# Altium footprint library ICs.PcbLib: 86 footprints (part 3 of 6) (continued)
## QFN28_LONG_ERRLES [mil] "QFN28_LONG_ERRLES"
pads (29):
  rect 14x50 smd: 1(-76.56,-118.56)
  oval 14x50 smd: 2(-51.55,-118.56) 3(-25.55,-118.56) 4(0.45,-118.56) 5(26.04,-118.56) 6(51.63,-118.56) 7(77.22,-118.56) 15(77.22,118.56) 16(51.63,118.56) 17(26.04,118.56) 18(0.45,118.56) 19(-25.55,118.56) 20(-51.55,118.56) 21(-76.56,118.56)
  oval 50x14 smd: 8(118.56,-77.22) 9(118.56,-51.63) 10(118.56,-26.04) 11(118.56,-0.44) 12(118.56,25.56) 13(118.56,51.56) 14(118.56,76.56) 22(-118.56,76.56) 23(-118.56,51.56) 24(-118.56,25.56) 25(-118.56,-0.44) 26(-118.56,-26.04) 27(-118.56,-51.63) 28(-118.56,-77.22)
  rrect20% 130x130 smd: EXP(0.45,-0.44)
Top Overlay:
  circle w11.81: c-125.54,-128.4 r3.94
  lines w8: -115.63,101.92 -115.63,114.56 -101.92,114.56 ; -114.56,-100.84 -114.56,-114.56 -101.92,-114.56 ; 100.84,-115.44 114.56,-115.44 114.56,-102.81 ; 100.84,113.67 113.48,113.67 113.48,99.95
Mechanical 15:
  circle w11.81: c-125.54,-130.37 r1.97
  lines w1.97: -149.16,-150.05 150.05,-150.05 150.05,149.16 -149.16,149.16 -149.16,-150.05
3D body: height 39.37, standoff 7.87, extent -113.73,-114.62 114.62,113.73

## QFN28_LONG_ERRLES-Vias [mm] "QFN28_LONG_ERRLES"
pads (42):
  rect 0.356x1.27 smd: 1(-1.944,-3.011)
  oval 0.356x1.27 smd: 2(-1.309,-3.011) 3(-0.649,-3.011) 4(0.011,-3.011) 5(0.661,-3.011) 6(1.311,-3.011) 7(1.961,-3.011) 15(1.961,3.011) 16(1.311,3.011) 17(0.661,3.011) 18(0.011,3.011) 19(-0.649,3.011) 20(-1.309,3.011) 21(-1.944,3.011)
  oval 1.27x0.356 smd: 8(3.011,-1.961) 9(3.011,-1.311) 10(3.011,-0.661) 11(3.011,-0.011) 12(3.011,0.649) 13(3.011,1.31) 14(3.011,1.945) 22(-3.011,1.945) 23(-3.011,1.31) 24(-3.011,0.649) 25(-3.011,-0.011) 26(-3.011,-0.661) 27(-3.011,-1.311) 28(-3.011,-1.961)
  round 0.6 hole 0.381: EXP(-1.25,-1.25) EXP(-1.25,1.25) EXP(-1.2,0) EXP(-0.55,-0.7) EXP(-0.55,0.7) EXP(-0.05,1.25) EXP(0,0) EXP(0.05,-1.25) EXP(0.55,-0.7) EXP(0.55,0.7) EXP(1.2,0) EXP(1.25,-1.25) EXP(1.25,1.25)
  rrect20% 3.302x3.302 smd: EXP(0.011,-0.011)
Top Overlay:
  circle w0.3: c-3.189,-3.261 r0.1
  lines w0.203: -2.937,2.589 -2.937,2.91 -2.589,2.91 ; -2.91,-2.561 -2.91,-2.91 -2.589,-2.91 ; 2.561,-2.932 2.91,-2.932 2.91,-2.611 ; 2.561,2.887 2.882,2.887 2.882,2.539
Mechanical 15:
  circle w0.3: c-3.189,-3.311 r0.05
  lines w0.05: -3.789,-3.811 -3.789,3.789 3.811,3.789 3.811,-3.811 -3.789,-3.811
3D body: height 1, standoff 0.2, extent -2.889,-2.911 2.911,2.889

## QFN32_L [mm] "32-Pin Quad Flat Pack 0.5 mm Pitch, IPC High Density"
height 1.85
pads (33):
  rrect20% 1x0.28 smd: 1(-2.5,1.75)
  oval 1x0.28 smd: 2(-2.5,1.25) 3(-2.5,0.75) 4(-2.5,0.25) 5(-2.5,-0.25) 6(-2.5,-0.75) 7(-2.5,-1.25) 8(-2.5,-1.75) 17(2.5,-1.75) 18(2.5,-1.25) 19(2.5,-0.75) 20(2.5,-0.25) 21(2.5,0.25) 22(2.5,0.75) 23(2.5,1.25) 24(2.5,1.75)
  oval 0.28x1 smd: 9(-1.75,-2.5) 10(-1.25,-2.5) 11(-0.75,-2.5) 12(-0.25,-2.5) 13(0.25,-2.5) 14(0.75,-2.5) 15(1.25,-2.5) 16(1.75,-2.5) 25(1.75,2.5) 26(1.25,2.5) 27(0.75,2.5) 28(0.25,2.5) 29(-0.25,2.5) 30(-0.75,2.5) 31(-1.25,2.5) 32(-1.75,2.5)
  rrect10% 2.6x2.6 smd: 33(0,0)
Top Overlay:
  circle w0.25: c-3.7,2.15 r0.125
  lines w0.2: -3.3,-3.3 -3.3,3.3 3.3,3.3 3.3,-3.3 -3.3,-3.3
Mechanical 1:
  lines w0.1: -2.5,-2.5 -2.5,2.5 2.5,2.5 2.5,-2.5 -2.5,-2.5
Mechanical 15:
  circle w0.1: c-3.7,2.15 r0.1
  lines w0.1: -0.5,0 0.5,0 ; 0,-0.5 0,0.5 ; -3.2,-3.2 -3.2,3.2 3.2,3.2 3.2,-3.2 -3.2,-3.2
3D body: height 1.85, standoff 0, extent -2.5,-2.5 2.5,2.5

## QFN32_L-Vias [mm] "32-Pin Quad Flat Pack 0.5 mm Pitch, IPC High Density"
height 1.85
pads (33):
  rrect20% 1x0.28 smd: 1(-2.5,1.75)
  oval 1x0.28 smd: 2(-2.5,1.25) 3(-2.5,0.75) 4(-2.5,0.25) 5(-2.5,-0.25) 6(-2.5,-0.75) 7(-2.5,-1.25) 8(-2.5,-1.75) 17(2.5,-1.75) 18(2.5,-1.25) 19(2.5,-0.75) 20(2.5,-0.25) 21(2.5,0.25) 22(2.5,0.75) 23(2.5,1.25) 24(2.5,1.75)
  oval 0.28x1 smd: 9(-1.75,-2.5) 10(-1.25,-2.5) 11(-0.75,-2.5) 12(-0.25,-2.5) 13(0.25,-2.5) 14(0.75,-2.5) 15(1.25,-2.5) 16(1.75,-2.5) 25(1.75,2.5) 26(1.25,2.5) 27(0.75,2.5) 28(0.25,2.5) 29(-0.25,2.5) 30(-0.75,2.5) 31(-1.25,2.5) 32(-1.75,2.5)
  rrect10% 2.6x2.6 smd: 33(0,0)
via 0,0 diameter 0.6 hole 0.381
via 0.95,0 diameter 0.6 hole 0.381
via -0.95,0 diameter 0.6 hole 0.381
via 0.95,-0.95 diameter 0.6 hole 0.381
via 0,-0.95 diameter 0.6 hole 0.381
via -1,-0.95 diameter 0.6 hole 0.381
via 0.95,0.95 diameter 0.6 hole 0.381
via 0,0.95 diameter 0.6 hole 0.381
via -0.95,0.95 diameter 0.6 hole 0.381
Top Overlay:
  circle w0.25: c-3.7,2.15 r0.125
  lines w0.2: -3.3,-3.3 3.3,-3.3 3.3,3.3 -3.3,3.3 -3.3,-3.3
Mechanical 1:
  lines w0.1: -2.5,-2.5 2.5,-2.5 2.5,2.5 -2.5,2.5 -2.5,-2.5
Mechanical 15:
  circle w0.1: c-3.7,2.15 r0.1
  lines w0.1: -0.5,0 0.5,0 ; 0,-0.5 0,0.5 ; -3.2,-3.2 3.2,-3.2 3.2,3.2 -3.2,3.2 -3.2,-3.2
3D body: height 1.85, standoff 0, extent -2.5,-2.5 2.5,2.5

## QFP32_L [mm] "32-Pin Quad Flat Pack 0.8 mm Pitch, IPC High Density"
height 1.85
pads (32):
  oval 1.35x0.55 smd: 1(-4.15,2.8) 2(-4.15,2) 3(-4.15,1.2) 4(-4.15,0.4) 5(-4.15,-0.4) 6(-4.15,-1.2) 7(-4.15,-2) 8(-4.15,-2.8) 17(4.15,-2.8) 18(4.15,-2) 19(4.15,-1.2) 20(4.15,-0.4) 21(4.15,0.4) 22(4.15,1.2) 23(4.15,2) 24(4.15,2.8)
  oval 0.55x1.35 smd: 9(-2.8,-4.15) 10(-2,-4.15) 11(-1.2,-4.15) 12(-0.4,-4.15) 13(0.4,-4.15) 14(1.2,-4.15) 15(2,-4.15) 16(2.8,-4.15) 25(2.8,4.15) 26(2,4.15) 27(1.2,4.15) 28(0.4,4.15) 29(-0.4,4.15) 30(-1.2,4.15) 31(-2,4.15) 32(-2.8,4.15)
Top Overlay:
  circle w0.25: c-4.15,3.625 r0.125
  lines w0.2: -3.05,-3.05 3.05,-3.05 3.05,3.05 -3.05,3.05 -3.05,-3.05
Mechanical 1:
  circle w0.1: c-4.15,3.6 r0.2
  lines w0.1: -3.5,-3.5 3.5,-3.5 3.5,3.5 -3.5,3.5 -3.5,-3.5
Mechanical 15:
  lines w0.1: -0.5,0 0.5,0 ; 0,-0.5 0,0.5 ; -4.9,-4.9 4.9,-4.9 4.9,4.9 -4.9,4.9 -4.9,-4.9
3D body: height 1.85, standoff 0, extent -3.5,-3.5 3.5,3.5

## Quad128 [mm]
pads (129):
  rect 8x8 smd: 0(0,0)
  rect 0.35x1.5 smd: 1(-9.25,-7.95)
  oval 0.35x1.5 smd: 2(-8.75,-7.95) 3(-8.25,-7.95) 4(-7.75,-7.95) 5(-7.25,-7.95) 6(-6.75,-7.95) 7(-6.25,-7.95) 8(-5.75,-7.95) 9(-5.25,-7.95) 10(-4.75,-7.95) 11(-4.25,-7.95) 12(-3.75,-7.95) 13(-3.25,-7.95) 14(-2.75,-7.95) 15(-2.25,-7.95) 16(-1.75,-7.95) 17(-1.25,-7.95) 18(-0.75,-7.95) 19(-0.25,-7.95) 20(0.25,-7.95) 21(0.75,-7.95) 22(1.25,-7.95) 23(1.75,-7.95) 24(2.25,-7.95) 25(2.75,-7.95) 26(3.25,-7.95) 27(3.75,-7.95) 28(4.25,-7.95) 29(4.75,-7.95) 30(5.25,-7.95) 31(5.75,-7.95) 32(6.25,-7.95) 33(6.75,-7.95) 34(7.25,-7.95) 35(7.75,-7.95) 36(8.25,-7.95) 37(8.75,-7.95) 38(9.25,-7.95) 65(9.25,7.95) 66(8.75,7.95) 67(8.25,7.95) 68(7.75,7.95) 69(7.25,7.95) 70(6.75,7.95) 71(6.25,7.95) 72(5.75,7.95) 73(5.25,7.95) 74(4.75,7.95) 75(4.25,7.95) 76(3.75,7.95) 77(3.25,7.95) 78(2.75,7.95) 79(2.25,7.95) 80(1.75,7.95) 81(1.25,7.95) 82(0.75,7.95) 83(0.25,7.95) 84(-0.25,7.95) 85(-0.75,7.95) 86(-1.25,7.95) 87(-1.75,7.95) 88(-2.25,7.95) 89(-2.75,7.95) 90(-3.25,7.95) 91(-3.75,7.95) 92(-4.25,7.95) 93(-4.75,7.95) 94(-5.25,7.95) 95(-5.75,7.95) 96(-6.25,7.95) 97(-6.75,7.95) 98(-7.25,7.95) 99(-7.75,7.95) 100(-8.25,7.95) 101(-8.75,7.95) 102(-9.25,7.95)
  oval 1.5x0.35 smd: 39(10.95,-6.25) 40(10.95,-5.75) 41(10.95,-5.25) 42(10.95,-4.75) 43(10.95,-4.25) 44(10.95,-3.75) 45(10.95,-3.25) 46(10.95,-2.75) 47(10.95,-2.25) 48(10.95,-1.75) 49(10.95,-1.25) 50(10.95,-0.75) 51(10.95,-0.25) 52(10.95,0.25) 53(10.95,0.75) 54(10.95,1.25) 55(10.95,1.75) 56(10.95,2.25) 57(10.95,2.75) 58(10.95,3.25) 59(10.95,3.75) 60(10.95,4.25) 61(10.95,4.75) 62(10.95,5.25) 63(10.95,5.75) 64(10.95,6.25) 103(-10.95,6.25) 104(-10.95,5.75) 105(-10.95,5.25) 106(-10.95,4.75) 107(-10.95,3.75) 108(-10.95,4.25) 109(-10.95,2.75) 110(-10.95,3.25) 111(-10.95,2.25) 112(-10.95,1.75) 113(-10.95,1.25) 114(-10.95,0.75) 115(-10.95,0.25) 116(-10.95,-0.25) 117(-10.95,-0.75) 118(-10.95,-1.25) 119(-10.95,-1.75) 120(-10.95,-2.25) 121(-10.95,-2.75) 122(-10.95,-3.25) 123(-10.95,-3.75) 124(-10.95,-4.25) 125(-10.95,-4.75) 126(-10.95,-5.25) 127(-10.95,-5.75) 128(-10.95,-6.25)
via 1.55,3.15 diameter 0.6 hole 0.381
via -1.55,3.15 diameter 0.6 hole 0.381
via -1.55,1.6 diameter 0.6 hole 0.381
via 1.55,1.6 diameter 0.6 hole 0.381
via 1.55,0 diameter 0.6 hole 0.381
via 1.55,-1.6 diameter 0.6 hole 0.381
via 1.55,-3.15 diameter 0.6 hole 0.381
via -1.55,-3.15 diameter 0.6 hole 0.381
via -1.55,-1.6 diameter 0.6 hole 0.381
via -1.55,0 diameter 0.6 hole 0.381
via 0,0 diameter 0.6 hole 0.381
via 3.2,-1.6 diameter 0.6 hole 0.381
via 3.2,1.6 diameter 0.6 hole 0.381
via 3.2,0 diameter 0.6 hole 0.381
via 0,-1.6 diameter 0.6 hole 0.381
via -0.05,1.6 diameter 0.6 hole 0.381
via -3.2,1.6 diameter 0.6 hole 0.381
via -3.2,-1.6 diameter 0.6 hole 0.381
via -3.2,0 diameter 0.6 hole 0.381
via 3.2,-3.15 diameter 0.6 hole 0.381
via -3.2,-3.15 diameter 0.6 hole 0.381
via 0,-3.15 diameter 0.6 hole 0.381
via 3.2,3.15 diameter 0.6 hole 0.381
via 0,3.15 diameter 0.6 hole 0.381
via -3.2,3.15 diameter 0.6 hole 0.381
Top Overlay:
  circle w0.3: c-9.25,-9.3 r0.206
  lines w0.2: -12.15,-9.15 12.15,-9.15 12.15,9.15 -12.15,9.15 -12.15,-9.15
Mechanical 1:
  lines w0.05: -9.85,-6.7 9.9,-6.7 9.9,6.75 -9.85,6.75 -9.85,-6.7
Mechanical 15:
  circle w0.3: c-9.25,-9.3 r0.206
  lines w0.05: -0.25,0 0.25,0 ; 0,-0.25 0,0.25 ; -12.1,-9.15 12.15,-9.15 12.15,9.1 -12.1,9.1 -12.1,-9.15
3D body: height 1, standoff 0, extent -9.85,-6.725 9.9,6.725

## R-783_3-0_5 [mm] "Recon DC-DC"
height 10.2
pads (3):
  rect 1.6x1.6 hole 1: 1(-2.54,0)
  round 1.6 hole 1: 2(0,0) 3(2.54,0)
Top Overlay:
  circle w0.25: c-4.7,-1.2 r0.125
  lines w0.2: -5.75,-2 5.75,-2 5.75,5.55 -5.75,5.55 -5.75,-2
Mechanical 15:
  lines w0.1: -0.5,0 0.5,0 ; 0,-0.5 0,0.5
3D body: height 10.2, standoff 0, extent -5.715,-2.032 5.715,5.588

## SG - 211 S*E [mm]
height 1.3
pads (4):
  rect 1.1x0.9 smd: 1(-0.85,-0.65) 2(0.85,-0.65) 3(0.85,0.65) 4(-0.85,0.65)
Top Overlay:
  circle w0.25: c-1.9,-1.55 r0.125
  lines w0.05: -1.6,-1.3 -1.6,1.3 1.6,1.3 1.6,-1.3 -1.6,-1.3
Mechanical 1:
  lines w0.1: -1.25,-1 1.25,-1 1.25,1 -1.25,1 -1.25,-1
Mechanical 15:
  lines w0.1: -0.5,0 0.5,0 ; 0,-0.5 0,0.5 ; -1.6,-1.3 1.6,-1.3 1.6,1.3 -1.6,1.3 -1.6,-1.3
3D body: height 1.3, standoff 0, extent -1.25,-1 1.25,1

## SKT256-6064 [mil] "SKT256-6064"
pads (262):
  round 40 / inner round 93 / far side round 40 hole 63: " "(-388.3,-388.3) " "(-388.3,388.3) " "(388.3,-388.3) " "(388.3,388.3)
  round 20 / inner round 80 / far side round 20 hole 34: " "(-388.3,-188.3) " "(388.3,288.3)
  round 20 smd: A1(-280.4,295.5) A2(-241,295.5) A3(-201.6,295.5) A4(-162.2,295.5) A5(-122.8,295.5) A6(-83.4,295.5) A7(-44,295.5) A8(-4.6,295.5) A9(34.8,295.5) A10(74.2,295.5) A11(113.6,295.5) A12(153,295.5) A13(192.4,295.5) A14(231.8,295.5) A15(271.2,295.5) A16(310.6,295.5) B1(-280.4,256.1) B2(-241,256.1) B3(-201.6,256.1) B4(-162.2,256.1) B5(-122.8,256.1) B6(-83.4,256.1) B7(-44,256.1) B8(-4.6,256.1) B9(34.8,256.1) B10(74.2,256.1) B11(113.6,256.1) B12(153,256.1) B13(192.4,256.1) B14(231.8,256.1) B15(271.2,256.1) B16(310.6,256.1) C1(-280.4,216.7) C2(-241,216.7) C3(-201.6,216.7) C4(-162.2,216.7) C5(-122.8,216.7) C6(-83.4,216.7) C7(-44,216.7) C8(-4.6,216.7) C9(34.8,216.7) C10(74.2,216.7) C11(113.6,216.7) C12(153,216.7) C13(192.4,216.7) C14(231.8,216.7) C15(271.2,216.7) C16(310.6,216.7) D1(-280.4,177.3) D2(-241,177.3) D3(-201.6,177.3) D4(-162.2,177.3) D5(-122.8,177.3) D6(-83.4,177.3) D7(-44,177.3) D8(-4.6,177.3) D9(34.8,177.3) D10(74.2,177.3) D11(113.6,177.3) D12(153,177.3) D13(192.4,177.3) D14(231.8,177.3) D15(271.2,177.3) D16(310.6,177.3) E1(-280.4,137.9) E2(-241,137.9) E3(-201.6,137.9) E4(-162.2,137.9) E5(-122.8,137.9) E6(-83.4,137.9) E7(-44,137.9) E8(-4.6,137.9) E9(34.8,137.9) E10(74.2,137.9) E11(113.6,137.9) E12(153,137.9) E13(192.4,137.9) E14(231.8,137.9) E15(271.2,137.9) E16(310.6,137.9) F1(-280.4,98.5) F2(-241,98.5) F3(-201.6,98.5) F4(-162.2,98.5) F5(-122.8,98.5) F6(-83.4,98.5) F7(-44,98.5) F8(-4.6,98.5) F9(34.8,98.5) F10(74.2,98.5) F11(113.6,98.5) F12(153,98.5) F13(192.4,98.5) F14(231.8,98.5) F15(271.2,98.5) F16(310.6,98.5) G1(-280.4,59.1) G2(-241,59.1) G3(-201.6,59.1) G4(-162.2,59.1) G5(-122.8,59.1) G6(-83.4,59.1) G7(-44,59.1) G8(-4.6,59.1) G9(34.8,59.1) G10(74.2,59.1) G11(113.6,59.1) G12(153,59.1) G13(192.4,59.1) G14(231.8,59.1) G15(271.2,59.1) G16(310.6,59.1) H1(-280.4,19.7) H2(-241,19.7) H3(-201.6,19.7) H4(-162.2,19.7) H5(-122.8,19.7) H6(-83.4,19.7) H7(-44,19.7) H8(-4.6,19.7) H9(34.8,19.7) H10(74.2,19.7) H11(113.6,19.7) H12(153,19.7) H13(192.4,19.7) H14(231.8,19.7) H15(271.2,19.7) H16(310.6,19.7) J1(-280.4,-19.7) J2(-241,-19.7) J3(-201.6,-19.7) J4(-162.2,-19.7) J5(-122.8,-19.7) J6(-83.4,-19.7) J7(-44,-19.7) J8(-4.6,-19.7) J9(34.8,-19.7) J10(74.2,-19.7) J11(113.6,-19.7) J12(153,-19.7) J13(192.4,-19.7) J14(231.8,-19.7) J15(271.2,-19.7) J16(310.6,-19.7) K1(-280.4,-59.1) K2(-241,-59.1) K3(-201.6,-59.1) K4(-162.2,-59.1) K5(-122.8,-59.1) K6(-83.4,-59.1) K7(-44,-59.1) K8(-4.6,-59.1) K9(34.8,-59.1) K10(74.2,-59.1) K11(113.6,-59.1) K12(153,-59.1) K13(192.4,-59.1) K14(231.8,-59.1) K15(271.2,-59.1) K16(310.6,-59.1) L1(-280.4,-98.5) L2(-241,-98.5) L3(-201.6,-98.5) L4(-162.2,-98.5) L5(-122.8,-98.5) L6(-83.4,-98.5) L7(-44,-98.5) L8(-4.6,-98.5) L9(34.8,-98.5) L10(74.2,-98.5) L11(113.6,-98.5) L12(153,-98.5) L13(192.4,-98.5) L14(231.8,-98.5) L15(271.2,-98.5) L16(310.6,-98.5) M1(-280.4,-137.9) M2(-241,-137.9) M3(-201.6,-137.9) M4(-162.2,-137.9) M5(-122.8,-137.9) M6(-83.4,-137.9) M7(-44,-137.9) M8(-4.6,-137.9) M9(34.8,-137.9) M10(74.2,-137.9) M11(113.6,-137.9) M12(153,-137.9) M13(192.4,-137.9) M14(231.8,-137.9) M15(271.2,-137.9) M16(310.6,-137.9) N1(-280.4,-177.3) N2(-241,-177.3) N3(-201.6,-177.3) N4(-162.2,-177.3) N5(-122.8,-177.3) N6(-83.4,-177.3) N7(-44,-177.3) N8(-4.6,-177.3) N9(34.8,-177.3) N10(74.2,-177.3) N11(113.6,-177.3) N12(153,-177.3) N13(192.4,-177.3) N14(231.8,-177.3) N15(271.2,-177.3) N16(310.6,-177.3) P1(-280.4,-216.7) P2(-241,-216.7) P3(-201.6,-216.7) P4(-162.2,-216.7) P5(-122.8,-216.7) P6(-83.4,-216.7) P7(-44,-216.7) P8(-4.6,-216.7) P9(34.8,-216.7) P10(74.2,-216.7) P11(113.6,-216.7) P12(153,-216.7) P13(192.4,-216.7) P14(231.8,-216.7) P15(271.2,-216.7) P16(310.6,-216.7) R1(-280.4,-256.1) R2(-241,-256.1) R3(-201.6,-256.1) R4(-162.2,-256.1) R5(-122.8,-256.1) R6(-83.4,-256.1) R7(-44,-256.1) R8(-4.6,-256.1) R9(34.8,-256.1) R10(74.2,-256.1) R11(113.6,-256.1) R12(153,-256.1) R13(192.4,-256.1) R14(231.8,-256.1) R15(271.2,-256.1) R16(310.6,-256.1) T1(-280.4,-295.5) T2(-241,-295.5) T3(-201.6,-295.5) T4(-162.2,-295.5) T5(-122.8,-295.5) T6(-83.4,-295.5) T7(-44,-295.5) T8(-4.6,-295.5) T9(34.8,-295.5) T10(74.2,-295.5) T11(113.6,-295.5) T12(153,-295.5) T13(192.4,-295.5) T14(231.8,-295.5) T15(271.2,-295.5) T16(310.6,-295.5)
Top Overlay:
  lines w6: -440,-440 -440,440 440,440 440,-440 -440,-440
Mechanical 15:
  text "N2" at -249,-177.3 h10
  text "A15" at 259.2,295.5 h10
  text "A16" at 298.6,295.5 h10
  text "B2" at -249,256.1 h10
  text "A1" at -288.4,295.5 h10
  text "A2" at -249,295.5 h10
  text "F8" at -12.6,98.5 h10
  text "E11" at 101.6,137.9 h10
  text "E10" at 62.2,137.9 h10
  text "F10" at 62.2,98.5 h10
  text "F9" at 26.8,98.5 h10
  text "G8" at -12.6,59.1 h10
  text "G9" at 26.8,59.1 h10
  text "E7" at -52,137.9 h10
  text "E6" at -91.4,137.9 h10
  text "H8" at -12.6,19.7 h10
  text "H9" at 26.8,19.7 h10
  text "K8" at -12.6,-59.1 h10
  text "J8" at -12.6,-19.7 h10
  text "L10" at 62.2,-98.5 h10
  text "M10" at 62.2,-137.9 h10
  text "L9" at 26.8,-98.5 h10
  text "M11" at 101.6,-137.9 h10
  text "J9" at 26.8,-19.7 h10
  text "K9" at 26.8,-59.1 h10
  text "M7" at -52,-137.9 h10
  text "L7" at -52,-98.5 h10
  text "M6" at -91.4,-137.9 h10
  text "L8" at -12.6,-98.5 h10
  text "T15" at 259.2,-295.5 h10
  text "T16" at 298.6,-295.5 h10
  text "T1" at -288.4,-295.5 h10
  text "T2" at -249,-295.5 h10
  text "M2" at -249,-137.9 h10
  text "L3" at -209.6,-98.5 h10
  text "D4" at -170.2,177.3 h10
  text "A7" at -52,295.5 h10
  text "C5" at -130.8,216.7 h10
  text "P2" at -249,-216.7 h10
  text "N6" at -91.4,-177.3 h10
  text "M1" at -288.4,-137.9 h10
  text "L2" at -249,-98.5 h10
  text "T7" at -52,-295.5 h10
  text "L16" at 298.6,-98.5 h10
  text "C7" at -52,216.7 h10
  text "N12" at 141,-177.3 h10
  text "B5" at -130.8,256.1 h10
  text "B6" at -91.4,256.1 h10
  text "B3" at -209.6,256.1 h10
  text "A3" at -209.6,295.5 h10
  text "N10" at 62.2,-177.3 h10
  text "T14" at 219.8,-295.5 h10
  text "P11" at 101.6,-216.7 h10
  text "N7" at -52,-177.3 h10
  text "L1" at -288.4,-98.5 h10
  text "R14" at 219.8,-256.1 h10
  text "B7" at -52,256.1 h10
  text "C8" at -12.6,216.7 h10
  text "N1" at -288.4,-177.3 h10
  text "P12" at 141,-216.7 h10
  text "N3" at -209.6,-177.3 h10
  text "T13" at 180.4,-295.5 h10
  text "B4" at -170.2,256.1 h10
  text "R15" at 259.2,-256.1 h10
  text "H12" at 141,19.7 h10
  text "H6" at -91.4,19.7 h10
  text "R13" at 180.4,-256.1 h10
  text "N8" at -12.6,-177.3 h10
  text "T3" at -209.6,-295.5 h10
  text "M14" at 219.8,-137.9 h10
  text "M3" at -209.6,-137.9 h10
  text "P15" at 259.2,-216.7 h10
  text "K3" at -209.6,-59.1 h10
  text "A5" at -130.8,295.5 h10
  text "P13" at 180.4,-216.7 h10
  text "N15" at 259.2,-177.3 h10
  text "A4" at -170.2,295.5 h10
  text "N13" at 180.4,-177.3 h10
  text "M15" at 259.2,-137.9 h10
  text "N11" at 101.6,-177.3 h10
  text "R9" at 26.8,-256.1 h10
  text "T9" at 26.8,-295.5 h10
  text "R10" at 62.2,-256.1 h10
  text "N9" at 26.8,-177.3 h10
  text "P9" at 26.8,-216.7 h10
  text "T10" at 62.2,-295.5 h10
  text "T12" at 141,-295.5 h10
  text "P8" at -12.6,-216.7 h10
  text "M13" at 180.4,-137.9 h10
  text "R8" at -12.6,-256.1 h10
  text "F7" at -52,98.5 h10
  text "P16" at 298.6,-216.7 h10
  text "B16" at 298.6,256.1 h10
  text "E8" at -12.6,137.9 h10
  text "E9" at 26.8,137.9 h10
  text "F11" at 101.6,98.5 h10
  text "E12" at 141,137.9 h10
  text "G12" at 141,59.1 h10
  text "F12" at 141,98.5 h10
  text "E5" at -130.8,137.9 h10
  text "F5" at -130.8,98.5 h10
  text "G5" at -130.8,59.1 h10
  text "M8" at -12.6,-137.9 h10
  text "M9" at 26.8,-137.9 h10
  text "M12" at 141,-137.9 h10
  text "L11" at 101.6,-98.5 h10
  text "L12" at 141,-98.5 h10
  text "K12" at 141,-59.1 h10
  text "M5" at -130.8,-137.9 h10
  text "K5" at -130.8,-59.1 h10
  text "L5" at -130.8,-98.5 h10
  text "R16" at 298.6,-256.1 h10
  text "R1" at -288.4,-256.1 h10
  text "P14" at 219.8,-216.7 h10
  text "N16" at 298.6,-177.3 h10
  text "D1" at -288.4,177.3 h10
  text "H10" at 62.2,19.7 h10
  text "H11" at 101.6,19.7 h10
  text "G11" at 101.6,59.1 h10
  text "G10" at 62.2,59.1 h10
  text "L6" at -91.4,-98.5 h10
  text "K6" at -91.4,-59.1 h10
  text "J6" at -91.4,-19.7 h10
  text "K11" at 101.6,-59.1 h10
  text "K10" at 62.2,-59.1 h10
  text "J11" at 101.6,-19.7 h10
  text "J12" at 141,-19.7 h10
  text "J10" at 62.2,-19.7 h10
  text "J7" at -52,-19.7 h10
  text "K7" at -52,-59.1 h10
  text "H7" at -52,19.7 h10
  text "G6" at -91.4,59.1 h10
  text "G7" at -52,59.1 h10
  text "F6" at -91.4,98.5 h10
  text "R12" at 141,-256.1 h10
  text "N14" at 219.8,-177.3 h10
  text "M16" at 298.6,-137.9 h10
  text "E2" at -249,137.9 h10
  text "F1" at -288.4,98.5 h10
  text "K1" at -288.4,-59.1 h10
  text "G3" at -209.6,59.1 h10
  text "J3" at -209.6,-19.7 h10
  text "J2" at -249,-19.7 h10
  text "R7" at -52,-256.1 h10
  text "J1" at -288.4,-19.7 h10
  text "H2" at -249,19.7 h10
  text "G2" at -249,59.1 h10
  text "C1" at -288.4,216.7 h10
  text "F2" at -249,98.5 h10
  text "C2" at -249,216.7 h10
  text "H1" at -288.4,19.7 h10
  text "B1" at -288.4,256.1 h10
  text "H3" at -209.6,19.7 h10
  text "C3" at -209.6,216.7 h10
  text "J5" at -130.8,-19.7 h10
  text "D2" at -249,177.3 h10
  text "J4" at -170.2,-19.7 h10
  text "E3" at -209.6,137.9 h10
  text "E4" at -170.2,137.9 h10
  text "H5" at -130.8,19.7 h10
  text "D3" at -209.6,177.3 h10
  text "F16" at 298.6,98.5 h10
  text "G14" at 219.8,59.1 h10
  text "G13" at 180.4,59.1 h10
  text "G16" at 298.6,59.1 h10
  text "P3" at -209.6,-216.7 h10
  text "H13" at 180.4,19.7 h10
  text "R5" at -130.8,-256.1 h10
  text "H16" at 298.6,19.7 h10
  text "J13" at 180.4,-19.7 h10
  text "R6" at -91.4,-256.1 h10
  text "P4" at -170.2,-216.7 h10
  text "J15" at 259.2,-19.7 h10
  text "P6" at -91.4,-216.7 h10
  text "C6" at -91.4,216.7 h10
  text "J16" at 298.6,-19.7 h10
  text "N4" at -170.2,-177.3 h10
  text "F4" at -170.2,98.5 h10
  text "G4" at -170.2,59.1 h10
  text "H14" at 219.8,19.7 h10
  text "G15" at 259.2,59.1 h10
  text "C16" at 298.6,216.7 h10
  text "T6" at -91.4,-295.5 h10
  text "N5" at -130.8,-177.3 h10
  text "K15" at 259.2,-59.1 h10
  text "D13" at 180.4,177.3 h10
  text "C15" at 259.2,216.7 h10
  text "B13" at 180.4,256.1 h10
  text "D6" at -91.4,177.3 h10
  text "A12" at 141,295.5 h10
  text "D14" at 219.8,177.3 h10
  text "K14" at 219.8,-59.1 h10
  text "R4" at -170.2,-256.1 h10
  text "B9" at 26.8,256.1 h10
  text "D15" at 259.2,177.3 h10
  text "P5" at -130.8,-216.7 h10
  text "D11" at 101.6,177.3 h10
  text "T5" at -130.8,-295.5 h10
  text "C10" at 62.2,216.7 h10
  text "C11" at 101.6,216.7 h10
  text "D10" at 62.2,177.3 h10
  text "R3" at -209.6,-256.1 h10
  text "C9" at 26.8,216.7 h10
  text "A10" at 62.2,295.5 h10
  text "B10" at 62.2,256.1 h10
  text "D16" at 298.6,177.3 h10
  text "B11" at 101.6,256.1 h10
  text "C12" at 141,216.7 h10
  text "B15" at 259.2,256.1 h10
  text "B12" at 141,256.1 h10
  text "D12" at 141,177.3 h10
  text "E13" at 180.4,137.9 h10
  text "A9" at 26.8,295.5 h10
  text "A11" at 101.6,295.5 h10
  text "L13" at 180.4,-98.5 h10
  text "C14" at 219.8,216.7 h10
  text "D9" at 26.8,177.3 h10
  text "E16" at 298.6,137.9 h10
  text "A8" at -12.6,295.5 h10
  text "C13" at 180.4,216.7 h10
  text "F13" at 180.4,98.5 h10
  text "G1" at -288.4,59.1 h10
  text "F15" at 259.2,98.5 h10
  text "F14" at 219.8,98.5 h10
  text "E15" at 259.2,137.9 h10
  text "E14" at 219.8,137.9 h10
  text "D7" at -52,177.3 h10
  text "P1" at -288.4,-216.7 h10
  text "K2" at -249,-59.1 h10
  text "A14" at 219.8,295.5 h10
  text "B8" at -12.6,256.1 h10
  text "B14" at 219.8,256.1 h10
  text "T4" at -170.2,-295.5 h10
  text "A13" at 180.4,295.5 h10
  text "M4" at -170.2,-137.9 h10
  text "L15" at 259.2,-98.5 h10
  text "A6" at -91.4,295.5 h10
  text "L14" at 219.8,-98.5 h10
  text "R2" at -249,-256.1 h10
  text "K16" at 298.6,-59.1 h10
  text "K4" at -170.2,-59.1 h10
  text "K13" at 180.4,-59.1 h10
  text "J14" at 219.8,-19.7 h10
  text "L4" at -170.2,-98.5 h10
  text "H15" at 259.2,19.7 h10
  text "C4" at -170.2,216.7 h10
  text "D8" at -12.6,177.3 h10
  text "R11" at 101.6,-256.1 h10
  text "T11" at 101.6,-295.5 h10
  text "P10" at 62.2,-216.7 h10
  text "D5" at -130.8,177.3 h10
  text "P7" at -52,-216.7 h10
  text "T8" at -12.6,-295.5 h10
  text "E1" at -288.4,137.9 h10
  text "H4" at -170.2,19.7 h10
  text "F3" at -209.6,98.5 h10
Mechanical 16:
  region: 490,490 -490,490 -490,-490 -415,-490 -415,-485 -305,-485 -305,-490 490,-490
  lines w1: -440,-440 -440,440 440,440 440,-440 -440,-440
Mechanical 17:
  text ".Designator" at -39.4,-407.5 h40
  text "OMAPL137AZKB3" at 13.6,-405.5 h40
  text "TOL" at 47.6,-407.5 h40
  text "PART#" at 3.6,-406.5 h40

## SMD-6 [mm]
height 5
pads (6):
  rect 1.9x1.75 smd: 1(-2.54,-4.76)
  rrect50% 1.9x1.75 smd: 2(0,-4.76) 3(2.54,-4.76) 4(2.54,4.76) 5(0,4.76) 6(-2.54,4.76)
Top Overlay:
  circle w0.25: c-4.3,-3.85 r0.107
  lines w0.2: -4,-3.05 -4,3.05 4,3.05 4,-3.05 -4,-3.05
Mechanical 1:
  lines w0.1: -4.121,-3.819 ccw(c-4.3,-3.85) -4.119,-3.864 ; -4,-3.05 -4,3.05 4,3.05 4,-3.05 -4,-3.05
Mechanical 15:
  lines w0.1: -0.5,0 0.5,0 ; 0,-0.5 0,0.5 ; -4.25,-5.85 -4.25,5.9 4.25,5.9 4.25,-5.85 -4.25,-5.85
3D body: height 5, standoff 0.58, extent -4,-3.05 4,3.05

## SO28 [mm]
pads (12):
  rect 2.6x0.58 smd: 1(-5,8.255)
  oval 2.6x0.58 smd: 2(-5,6.985) 3(-5,5.715) 12(-5,-5.715) 13(-5,-6.985) 14(-5,-8.255) 15(5,-8.255) 16(5,-6.985) 17(5,-5.715) 26(5,5.715) 27(5,6.985) 28(5,8.255)
Top Overlay:
  circle w0.25: c-4,9.65 r0.125
  lines w0.2: -3.45,-8.65 3.45,-8.65 3.45,8.65 -3.45,8.65 -3.45,-8.65
Mechanical 1:
  circle w0.1: c-4,9.65 r0.206
  lines w0.1: -3.45,-8.65 3.45,-8.65 3.45,8.6 -3.45,8.6 -3.45,-8.65
Mechanical 15:
  lines w0.1: -0.5,0 0.5,0 ; 0,-0.5 0,0.5 ; -6.6,-8.8 6.7,-8.8 6.7,8.8 -6.6,8.8 -6.6,-8.8
3D body: height 2.6, standoff 0, extent -3.45,-8.65 3.4,8.65

## SO-16_L [mm] "SOIC, 16-Leads, Body 9.9x3.9mm, Pitch 1.27mm, IPC High Density"
height 1.75
pads (16):
  rect 1.9x0.6 smd: 1(-2.35,4.445)
  oval 1.9x0.6 smd: 2(-2.35,3.175) 3(-2.35,1.905) 4(-2.35,0.635) 5(-2.35,-0.635) 6(-2.35,-1.905) 7(-2.35,-3.175) 8(-2.35,-4.445) 9(2.35,-4.445) 10(2.35,-3.175) 11(2.35,-1.905) 12(2.35,-0.635) 13(2.35,0.635) 14(2.35,1.905) 15(2.35,3.175) 16(2.35,4.445)
Top Overlay:
  circle w0.25: c-2.35,5.295 r0.125
  lines w0.2: -1,-5 1,-5 1,5 -1,5 -1,-5
Mechanical 1:
  circle w0.1: c-2.3,5.3 r0.2
  lines w0.1: -2,-5 2,-5 2,5 -2,5 -2,-5
Mechanical 15:
  lines w0.1: -0.5,0 0.5,0 ; 0,-0.5 0,0.5 ; -3.4,-5.1 3.4,-5.1 3.4,5.1 -3.4,5.1 -3.4,-5.1
3D body "soic-16-n.stp": height 1.95, standoff -0.05, extent -3.04,-5 3.04,5